# Altium footprint library Tomra_Cadstar_Footprints.PcbLib: 373 footprints (part 18 of 24)
Each footprint in its own frame and in the unit in brackets; x right, y up, seen from the top. Pads: shape width x height; smd on the part's side, far side on the other; paste and mask are expansions set on the pad; w line width, h text height; cw(c..) or ccw(c..) is an arc to the next point about the centre after c.
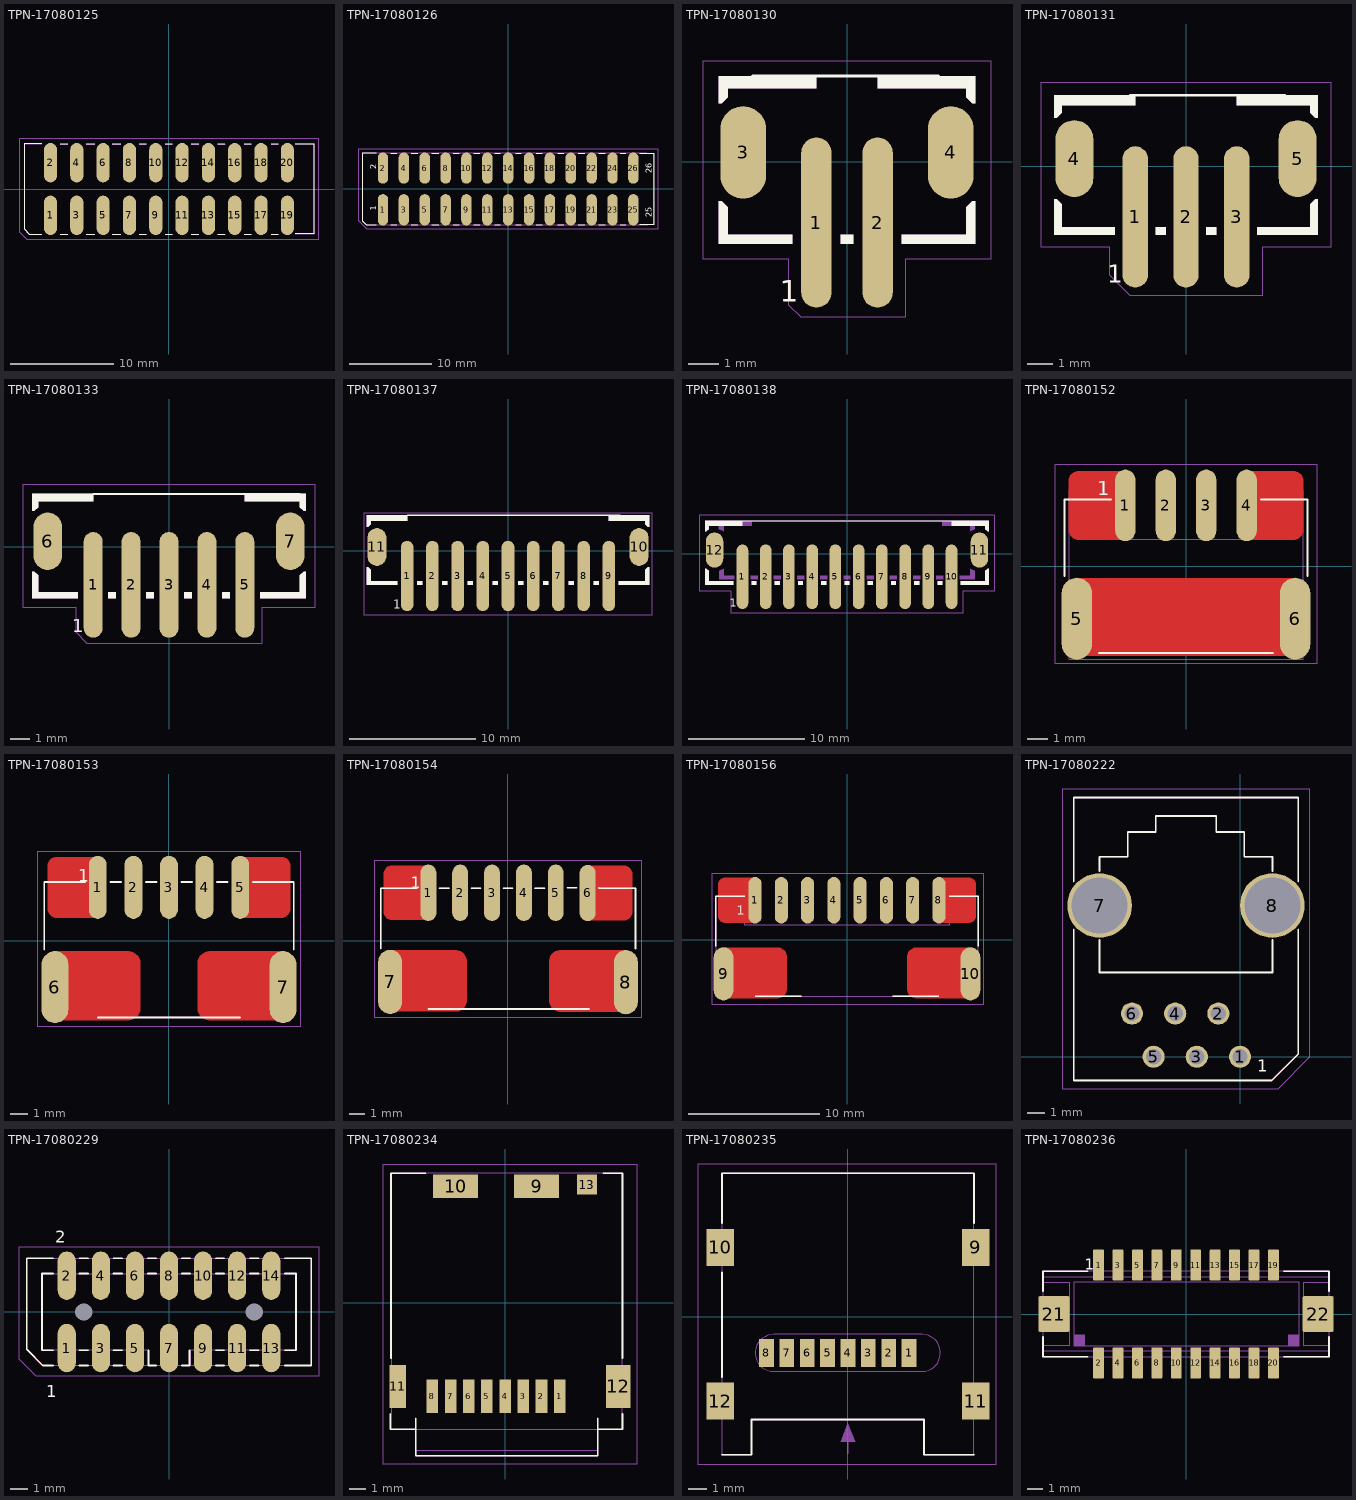
[diagram p17: the footprints below, top view; thin cyan lines are the x and y axes]

## TPN-17080125 [mm]
height 12
pads (20):
  oval 1.27x3.81 smd paste+0 mask+0: 1(-11.43,-2.54) 2(-11.43,2.54) 3(-8.89,-2.54) 4(-8.89,2.54) 5(-6.35,-2.54) 6(-6.35,2.54) 7(-3.81,-2.54) 8(-3.81,2.54) 9(-1.27,-2.54) 10(-1.27,2.54) 11(1.27,-2.54) 12(1.27,2.54) 13(3.81,-2.54) 14(3.81,2.54) 15(6.35,-2.54) 16(6.35,2.54) 17(8.89,-2.54) 18(8.89,2.54) 19(11.43,-2.54) 20(11.43,2.54)
Top Silk:
  lines w0.1: -12.27,-4.35 -13.47,-4.35 -13.97,-3.85 -13.97,4.35 -12.27,4.35 ; -10.47,-4.35 -9.77,-4.35 ; -10.47,4.35 -9.77,4.35 ; -7.97,-4.35 -7.17,-4.35 ; -7.97,4.35 -7.17,4.35 ; -5.47,-4.35 -4.67,-4.35 ; -5.47,4.35 -4.67,4.35 ; -2.87,-4.35 -2.17,-4.35 ; -2.87,4.35 -2.17,4.35 ; -0.37,-4.35 0.33,-4.35 ; -0.37,4.35 0.33,4.35 ; 2.17,-4.35 2.87,-4.35 ; 2.17,4.35 2.87,4.35 ; 4.71,-4.35 5.41,-4.35 ; 4.71,4.35 5.41,4.35 ; 7.25,-4.35 7.95,-4.35 ; 7.25,4.35 7.95,4.35 ; 9.85,-4.35 10.55,-4.35 ; 9.85,4.35 10.55,4.35 ; 12.18,-4.34 13.98,-4.34 13.98,4.36 12.18,4.36
  text ".Designator" at 0,0 h0.7
Top Assembly:
  lines w0.05: -12.268,-4.357 -13.468,-4.357 -13.968,-3.857 -13.968,4.343 -12.268,4.343 ; -10.468,-4.357 -9.768,-4.357 ; -10.468,4.343 -9.768,4.343 ; -7.968,-4.357 -7.168,-4.357 ; -7.968,4.343 -7.168,4.343 ; -5.468,-4.357 -4.668,-4.357 ; -5.468,4.343 -4.668,4.343 ; -2.868,-4.357 -2.168,-4.357 ; -2.868,4.343 -2.168,4.343 ; -0.368,-4.357 0.332,-4.357 ; -0.368,4.343 0.332,4.343 ; 2.172,-4.357 2.872,-4.357 ; 2.172,4.343 2.872,4.343 ; 4.712,-4.357 5.412,-4.357 ; 4.712,4.343 5.412,4.343 ; 7.252,-4.357 7.952,-4.357 ; 7.252,4.343 7.952,4.343 ; 9.852,-4.357 10.552,-4.357 ; 9.852,4.343 10.552,4.343 ; 12.182,-4.347 13.982,-4.347 13.982,4.353 12.182,4.353
Top Placement:
  lines w0.01: -14.47,-4.115 -13.738,-4.847 14.482,-4.847 14.482,4.85 -14.47,4.85 -14.47,-4.115

## TPN-17080126 [mm]
height 12
pads (26):
  oval 1.27x3.81 smd paste+0 mask+0: 1(-15.24,-2.54) 2(-15.24,2.54) 3(-12.7,-2.54) 4(-12.7,2.54) 5(-10.16,-2.54) 6(-10.16,2.54) 7(-7.62,-2.54) 8(-7.62,2.54) 9(-5.08,-2.54) 10(-5.08,2.54) 11(-2.54,-2.54) 12(-2.54,2.54) 13(0,-2.54) 14(0,2.54) 15(2.54,-2.54) 16(2.54,2.54) 17(5.08,-2.54) 18(5.08,2.54) 19(7.62,-2.54) 20(7.62,2.54) 21(10.16,-2.54) 22(10.16,2.54) 23(12.7,-2.54) 24(12.7,2.54) 25(15.24,-2.54) 26(15.24,2.54)
Top Silk:
  lines w0.1: -16.08,-4.35 -17.28,-4.35 -17.78,-3.85 -17.78,4.35 -16.08,4.35 ; -14.28,-4.35 -13.58,-4.35 ; -14.28,4.35 -13.58,4.35 ; -11.78,-4.35 -10.98,-4.35 ; -11.78,4.35 -10.98,4.35 ; -9.28,-4.35 -8.48,-4.35 ; -9.28,4.35 -8.48,4.35 ; -6.68,-4.35 -5.98,-4.35 ; -6.68,4.35 -5.98,4.35 ; -4.18,-4.35 -3.48,-4.35 ; -4.18,4.35 -3.48,4.35 ; -1.64,-4.35 -0.94,-4.35 ; -1.64,4.35 -0.94,4.35 ; 0.9,-4.35 1.6,-4.35 ; 0.9,4.35 1.6,4.35 ; 3.44,-4.35 4.14,-4.35 ; 3.44,4.35 4.14,4.35 ; 6.04,-4.35 6.74,-4.35 ; 6.04,4.35 6.74,4.35 ; 8.54,-4.35 9.34,-4.35 ; 8.54,4.35 9.34,4.35 ; 11.04,-4.35 11.84,-4.35 ; 11.04,4.35 11.84,4.35 ; 13.64,-4.35 14.34,-4.35 ; 13.64,4.35 14.34,4.35 ; 16.035,-4.361 17.735,-4.361 17.735,4.339 16.035,4.339
  text "2" at -16.053,2.413 h0.7
  text "1" at -16.053,-2.667 h0.7
  text "2" at -16.053,2.413 h0.7
  text "1" at -16.053,-2.667 h0.7
  text "26" at 17.47,1.894 h0.7
  text "25" at 17.47,-3.44 h0.7
  text "25" at 17.47,-3.44 h0.7
  text "26" at 17.47,1.894 h0.7
  text ".Designator" at 0,0 h0.7
Top Assembly:
  lines w0.05: 15.97,-4.34 17.67,-4.34 17.67,4.36 15.97,4.36 ; 16.87,4.36 -17.78,4.35 -17.78,-3.85 -17.28,-4.35 16.97,-4.34
  text "2" at -16.053,2.413 h0.7
  text "1" at -16.053,-2.667 h0.7
  text "2" at -16.053,2.413 h0.7
  text "1" at -16.053,-2.667 h0.7
  text "25" at 17.47,-3.44 h0.7
  text "26" at 17.47,1.894 h0.7
Top Placement:
  lines w0.01: -18.28,-3.81 -17.229,-4.861 18.235,-4.861 18.235,4.85 -18.28,4.85 -18.28,-3.81

## TPN-17080130 [mm]
height 7
pads (4):
  oval 1x5.572 smd paste+0 mask+0: 1(-1,-2) 2(1,-2)
  oval 1.5x3.024 smd paste+0 mask+0: 3(-3.4,0.3) 4(3.4,0.3)
Top Silk:
  region: 1,2.8 4.2,2.8 4.2,1.9 4.1,1.9 3.9,2.1 3.9,2.4 1,2.4
  region: -1,2.8 -4.2,2.8 -4.2,1.9 -4.1,1.9 -3.9,2.1 -3.9,2.4 -1,2.4
  region: -0.2,-2.4 0.2,-2.4 0.2,-2.7 -0.2,-2.7
  region: -4.2,-1.3 -4.1,-1.3 -3.9,-1.5 -3.9,-2.4 -1.8,-2.4 -1.8,-2.7 -4.2,-2.7
  region: 4.2,-1.3 4.1,-1.3 3.9,-1.5 3.9,-2.4 1.8,-2.4 1.8,-2.7 4.2,-2.7
  lines w0.1: -3.1,2.8 3,2.8
  text "1" at -2.2,-4.6 h0.7
  text ".Designator" at 0,0 h0.7
Top Assembly:
  region: 1,2.8 4.2,2.8 4.2,1.9 4.1,1.9 3.9,2.1 3.9,2.4 1,2.4
  region: -1,2.8 -4.2,2.8 -4.2,1.9 -4.1,1.9 -3.9,2.1 -3.9,2.4 -1,2.4
  region: -0.2,-2.4 0.2,-2.4 0.2,-2.7 -0.2,-2.7
  region: -4.2,-1.3 -4.1,-1.3 -3.9,-1.5 -3.9,-2.4 -1.8,-2.4 -1.8,-2.7 -4.2,-2.7
  region: 4.2,-1.3 4.1,-1.3 3.9,-1.5 3.9,-2.4 1.8,-2.4 1.8,-2.7 4.2,-2.7
  lines w0.05: -3.1,2.8 3,2.8
  text "1" at -2.1,-4.6 h0.7
Top Placement:
  lines w0.01: -4.7,-3.2 -4.7,3.3 4.7,3.3 4.7,-3.2 1.9,-3.2 1.9,-5.1 -1.5,-5.1 -1.9,-4.7 -1.9,-3.2 -4.7,-3.2
  text "JST PH-2" at -2.4,1.1 h0.7

## TPN-17080131 [mm]
height 7
pads (5):
  oval 1x5.572 smd paste+0 mask+0: 1(-2,-2) 2(0,-2) 3(2,-2)
  oval 1.5x3.024 smd paste+0 mask+0: 4(-4.4,0.3) 5(4.4,0.3)
Top Silk:
  region: -2,2.8 -5.2,2.8 -5.2,1.9 -5.1,1.9 -4.9,2.1 -4.9,2.4 -2,2.4
  region: -1.2,-2.4 -0.8,-2.4 -0.8,-2.7 -1.2,-2.7
  region: -5.2,-1.3 -5.1,-1.3 -4.9,-1.5 -4.9,-2.4 -2.8,-2.4 -2.8,-2.7 -5.2,-2.7
  region: 2,2.8 5.2,2.8 5.2,1.9 5.1,1.9 4.9,2.1 4.9,2.4 2,2.4
  region: 5.2,-1.3 5.1,-1.3 4.9,-1.5 4.9,-2.4 2.8,-2.4 2.8,-2.7 5.2,-2.7
  region: 0.8,-2.4 1.2,-2.4 1.2,-2.7 0.8,-2.7
  lines w0.1: -2.2,2.8 3.9,2.8
  text "1" at -3.1,-4.6 h0.7
  text ".Designator" at 0,0 h0.7
Top Assembly:
  region: -2,2.8 -5.2,2.8 -5.2,1.9 -5.1,1.9 -4.9,2.1 -4.9,2.4 -2,2.4
  region: -1.2,-2.4 -0.8,-2.4 -0.8,-2.7 -1.2,-2.7
  region: -5.2,-1.3 -5.1,-1.3 -4.9,-1.5 -4.9,-2.4 -2.8,-2.4 -2.8,-2.7 -5.2,-2.7
  region: 2,2.8 5.2,2.8 5.2,1.9 5.1,1.9 4.9,2.1 4.9,2.4 2,2.4
  region: 5.2,-1.3 5.1,-1.3 4.9,-1.5 4.9,-2.4 2.8,-2.4 2.8,-2.7 5.2,-2.7
  region: 0.8,-2.4 1.2,-2.4 1.2,-2.7 0.8,-2.7
  lines w0.05: -2.2,2.8 3.9,2.8
  text "1" at -3,-4.6 h0.7
Top Placement:
  lines w0.01: -5.7,-3.2 -5.7,3.3 5.7,3.3 5.7,-3.2 3,-3.2 3,-5.1 -2.2,-5.1 -3,-4.3 -3,-3.2 -5.7,-3.2
  text "JST PH-3" at -2.6,1.1 h0.7

## TPN-17080133 [mm]
height 7
pads (7):
  oval 1x5.572 smd paste+0 mask+0: 1(-4,-2) 2(-2,-2) 3(0,-2) 4(2,-2) 5(4,-2)
  oval 1.5x3.024 smd paste+0 mask+0: 6(-6.4,0.3) 7(6.4,0.3)
Top Silk:
  region: 0.8,-2.4 1.2,-2.4 1.2,-2.7 0.8,-2.7
  region: 7.2,-1.3 7.1,-1.3 6.9,-1.5 6.9,-2.4 4.8,-2.4 4.8,-2.7 7.2,-2.7
  region: 4,2.8 7.2,2.8 7.2,1.9 7.1,1.9 6.9,2.1 6.9,2.4 4,2.4
  region: 2.8,-2.4 3.2,-2.4 3.2,-2.7 2.8,-2.7
  region: -4,2.8 -7.2,2.8 -7.2,1.9 -7.1,1.9 -6.9,2.1 -6.9,2.4 -4,2.4
  region: -3.2,-2.4 -2.8,-2.4 -2.8,-2.7 -3.2,-2.7
  region: -7.2,-1.3 -7.1,-1.3 -6.9,-1.5 -6.9,-2.4 -4.8,-2.4 -4.8,-2.7 -7.2,-2.7
  region: -1.2,-2.4 -0.8,-2.4 -0.8,-2.7 -1.2,-2.7
  lines w0.1: -4,2.8 6.9,2.8
  text "1" at -5.1,-4.5 h0.7
  text ".Designator" at 0,0 h0.7
Top Assembly:
  region: 0.8,-2.4 1.2,-2.4 1.2,-2.7 0.8,-2.7
  region: 7.2,-1.3 7.1,-1.3 6.9,-1.5 6.9,-2.4 4.8,-2.4 4.8,-2.7 7.2,-2.7
  region: 4,2.8 7.2,2.8 7.2,1.9 7.1,1.9 6.9,2.1 6.9,2.4 4,2.4
  region: 2.8,-2.4 3.2,-2.4 3.2,-2.7 2.8,-2.7
  region: -4,2.8 -7.2,2.8 -7.2,1.9 -7.1,1.9 -6.9,2.1 -6.9,2.4 -4,2.4
  region: -3.2,-2.4 -2.8,-2.4 -2.8,-2.7 -3.2,-2.7
  region: -7.2,-1.3 -7.1,-1.3 -6.9,-1.5 -6.9,-2.4 -4.8,-2.4 -4.8,-2.7 -7.2,-2.7
  region: -1.2,-2.4 -0.8,-2.4 -0.8,-2.7 -1.2,-2.7
  lines w0.05: -4,2.8 6.9,2.8
  text "1" at -5,-4.5 h0.7
Top Placement:
  lines w0.01: -7.7,-3.2 -7.7,3.3 7.7,3.3 7.7,-3.2 4.9,-3.2 4.9,-5.1 -4.3,-5.1 -4.9,-4.5 -4.9,-3.2 -7.7,-3.2
  text "JST PH-5-180" at -3.8,1.1 h0.7

## TPN-17080137 [mm]
height 7
pads (11):
  oval 1x5.572 smd paste+0 mask+0: 1(-8,-2) 2(-6,-2) 3(-4,-2) 4(-2,-2) 5(0,-2) 6(2,-2) 7(4,-2) 8(6,-2) 9(8,-2)
  oval 1.5x3 smd paste+0 mask+0: 10(10.4,0.3) 11(-10.4,0.3)
Top Silk:
  region: -3.2,-2.4 -2.8,-2.4 -2.8,-2.7 -3.2,-2.7
  region: -1.2,-2.4 -0.8,-2.4 -0.8,-2.7 -1.2,-2.7
  region: -8,2.8 -11.2,2.8 -11.2,1.9 -11.1,1.9 -10.9,2.1 -10.9,2.4 -8,2.4
  region: -7.2,-2.4 -6.8,-2.4 -6.8,-2.7 -7.2,-2.7
  region: -11.2,-1.3 -11.1,-1.3 -10.9,-1.5 -10.9,-2.4 -8.8,-2.4 -8.8,-2.7 -11.2,-2.7
  region: -5.2,-2.4 -4.8,-2.4 -4.8,-2.7 -5.2,-2.7
  region: 0.8,-2.4 1.2,-2.4 1.2,-2.7 0.8,-2.7
  region: 2.8,-2.4 3.2,-2.4 3.2,-2.7 2.8,-2.7
  region: 4.8,-2.4 5.2,-2.4 5.2,-2.7 4.8,-2.7
  region: 11.2,-1.3 11.1,-1.3 10.9,-1.5 10.9,-2.4 8.8,-2.4 8.8,-2.7 11.2,-2.7
  region: 8,2.8 11.2,2.8 11.2,1.9 11.1,1.9 10.9,2.1 10.9,2.4 8,2.4
  region: 6.8,-2.4 7.2,-2.4 7.2,-2.7 6.8,-2.7
  lines w0.1: -8,2.8 8.9,2.8
  text "1" at -9.1,-4.6 h0.7
  text ".Designator" at -11.2,2.8 h0.7
Top Assembly:
  region: -3.2,-2.4 -2.8,-2.4 -2.8,-2.7 -3.2,-2.7
  region: -1.2,-2.4 -0.8,-2.4 -0.8,-2.7 -1.2,-2.7
  region: -8,2.8 -11.2,2.8 -11.2,1.9 -11.1,1.9 -10.9,2.1 -10.9,2.4 -8,2.4
  region: -7.2,-2.4 -6.8,-2.4 -6.8,-2.7 -7.2,-2.7
  region: -11.2,-1.3 -11.1,-1.3 -10.9,-1.5 -10.9,-2.4 -8.8,-2.4 -8.8,-2.7 -11.2,-2.7
  region: -5.2,-2.4 -4.8,-2.4 -4.8,-2.7 -5.2,-2.7
  region: 0.8,-2.4 1.2,-2.4 1.2,-2.7 0.8,-2.7
  region: 2.8,-2.4 3.2,-2.4 3.2,-2.7 2.8,-2.7
  region: 4.8,-2.4 5.2,-2.4 5.2,-2.7 4.8,-2.7
  region: 11.2,-1.3 11.1,-1.3 10.9,-1.5 10.9,-2.4 8.8,-2.4 8.8,-2.7 11.2,-2.7
  region: 8,2.8 11.2,2.8 11.2,1.9 11.1,1.9 10.9,2.1 10.9,2.4 8,2.4
  region: 6.8,-2.4 7.2,-2.4 7.2,-2.7 6.8,-2.7
  lines w0.05: -8,2.8 8.9,2.8
  text "1" at -9,-4.6 h0.7
Top Placement:
  lines w0.01: -11.4,-5.1 11.4,-5.1 11.4,3 -11.4,3 -11.4,-5.1

## TPN-17080138 [mm]
height 7
pads (12):
  oval 1x5.572 smd paste+0 mask+0: 1(-9,-2) 2(-7,-2) 3(-5,-2) 4(-3,-2) 5(-1,-2) 6(1,-2) 7(3,-2) 8(5,-2) 9(7,-2) 10(9,-2)
  oval 1.5x3.024 smd paste+0 mask+0: 11(11.4,0.3) 12(-11.4,0.3)
Top Silk:
  region: -4.2,-2.4 -3.8,-2.4 -3.8,-2.7 -4.2,-2.7
  region: -2.2,-2.4 -1.8,-2.4 -1.8,-2.7 -2.2,-2.7
  region: -9,2.8 -12.2,2.8 -12.2,1.9 -12.1,1.9 -11.9,2.1 -11.9,2.4 -9,2.4
  region: -8.2,-2.4 -7.8,-2.4 -7.8,-2.7 -8.2,-2.7
  region: -12.2,-1.3 -12.1,-1.3 -11.9,-1.5 -11.9,-2.4 -9.8,-2.4 -9.8,-2.7 -12.2,-2.7
  region: -6.2,-2.4 -5.8,-2.4 -5.8,-2.7 -6.2,-2.7
  region: -0.2,-2.4 0.2,-2.4 0.2,-2.7 -0.2,-2.7
  region: 1.8,-2.4 2.2,-2.4 2.2,-2.7 1.8,-2.7
  region: 3.8,-2.4 4.2,-2.4 4.2,-2.7 3.8,-2.7
  region: 5.8,-2.4 6.2,-2.4 6.2,-2.7 5.8,-2.7
  region: 12.2,-1.3 12.1,-1.3 11.9,-1.5 11.9,-2.4 9.8,-2.4 9.8,-2.7 12.2,-2.7
  region: 9,2.8 12.2,2.8 12.2,1.9 12.1,1.9 11.9,2.1 11.9,2.4 9,2.4
  region: 7.8,-2.4 8.2,-2.4 8.2,-2.7 7.8,-2.7
  lines w0.1: -9,2.8 11.9,2.8
  text "1" at -10.1,-4.6 h0.7
  text ".Designator" at 0,0 h0.7
Top Assembly:
  region: -0.3,-1.9 0.3,-1.9 0.3,-2.2 -0.3,-2.2
  region: 3.7,-1.9 4.3,-1.9 4.3,-2.2 3.7,-2.2
  region: 1.7,-1.9 2.3,-1.9 2.3,-2.2 1.7,-2.2
  region: -8.3,-1.9 -7.7,-1.9 -7.7,-2.2 -8.3,-2.2
  region: -6.3,-1.9 -5.7,-1.9 -5.7,-2.2 -6.3,-2.2
  region: -4.3,-1.9 -3.7,-1.9 -3.7,-2.2 -4.3,-2.2
  region: -2.3,-1.9 -1.7,-1.9 -1.7,-2.2 -2.3,-2.2
  region: -8.2,2.8 -8.2,2.4 -10.6,2.4 -10.6,1.9 -11,2.1 -11,2.8
  region: -11,-1.5 -11,-2.2 -9.7,-2.2 -9.7,-1.9 -10.6,-1.9 -10.6,-1.3
  region: 5.7,-1.9 6.3,-1.9 6.3,-2.2 5.7,-2.2
  region: 8.2,2.8 8.2,2.4 10.6,2.4 10.6,1.9 11,2.1 11,2.8
  region: 11,-1.5 11,-2.2 9.7,-2.2 9.7,-1.9 10.6,-1.9 10.6,-1.3
  region: 7.7,-1.9 8.3,-1.9 8.3,-2.2 7.7,-2.2
  region: -4.2,-2.4 -3.8,-2.4 -3.8,-2.7 -4.2,-2.7
  region: -2.2,-2.4 -1.8,-2.4 -1.8,-2.7 -2.2,-2.7
  region: -9,2.8 -12.2,2.8 -12.2,1.9 -12.1,1.9 -11.9,2.1 -11.9,2.4 -9,2.4
  region: -8.2,-2.4 -7.8,-2.4 -7.8,-2.7 -8.2,-2.7
  region: -12.2,-1.3 -12.1,-1.3 -11.9,-1.5 -11.9,-2.4 -9.8,-2.4 -9.8,-2.7 -12.2,-2.7
  region: -6.2,-2.4 -5.8,-2.4 -5.8,-2.7 -6.2,-2.7
  region: -0.2,-2.4 0.2,-2.4 0.2,-2.7 -0.2,-2.7
  region: 1.8,-2.4 2.2,-2.4 2.2,-2.7 1.8,-2.7
  region: 3.8,-2.4 4.2,-2.4 4.2,-2.7 3.8,-2.7
  region: 5.8,-2.4 6.2,-2.4 6.2,-2.7 5.8,-2.7
  region: 12.2,-1.3 12.1,-1.3 11.9,-1.5 11.9,-2.4 9.8,-2.4 9.8,-2.7 12.2,-2.7
  region: 9,2.8 12.2,2.8 12.2,1.9 12.1,1.9 11.9,2.1 11.9,2.4 9,2.4
  region: 7.8,-2.4 8.2,-2.4 8.2,-2.7 7.8,-2.7
  lines w0.05: -11,2.1 -11,2.8 10.8,2.8 10.8,2.1 ; -9,2.8 11.9,2.8
  text "1" at -10.1,-4.2 h0.7
Top Placement:
  lines w0.01: -12.7,-3.2 -10,-3.2 -10,-5.105 10,-5.105 10,-3.2 12.7,-3.2 12.7,3.3 -12.7,3.3 -12.7,-3.2
  text "JST PH-10-180" at -3.6,1.3 h0.7

## TPN-17080152 [mm]
height 5.8
pads (6):
  oval 1x3.54 smd paste+0 mask+0: 1(-3,3) 2(-1,3) 3(1,3) 4(3,3)
  oval 1.5x4.04 smd paste+0 mask+0: 5(-5.4,-2.6) 6(5.4,-2.6)
Top Elec:
  region: -6,-1.3 -6,-1.231 -5.973,-1.096 -5.92,-0.968 -5.844,-0.854 -5.746,-0.756 -5.632,-0.68 -5.504,-0.627 -5.369,-0.6 -5.3,-0.6 5.3,-0.6 5.369,-0.6 5.504,-0.627 5.632,-0.68 5.746,-0.756 5.844,-0.854 5.92,-0.968 5.973,-1.096 6,-1.231 6,-1.3 6,-3.75 6,-3.819 5.973,-3.954 5.92,-4.082 5.844,-4.196 5.746,-4.294 5.632,-4.37 5.504,-4.423 5.369,-4.45 5.3,-4.45 -5.3,-4.45 -5.369,-4.45 -5.504,-4.423 -5.632,-4.37 -5.746,-4.294 -5.844,-4.196 -5.92,-4.082 -5.973,-3.954 -6,-3.819 -6,-3.75
  region: -5.8,4.2 -5.8,4.299 -5.724,4.483 -5.583,4.624 -5.399,4.7 -5.3,4.7 -3.1,4.7 -3.001,4.7 -2.817,4.624 -2.676,4.483 -2.6,4.299 -2.6,4.2 -2.6,1.8 -2.6,1.701 -2.676,1.517 -2.817,1.376 -3.001,1.3 -3.1,1.3 -5.3,1.3 -5.399,1.3 -5.583,1.376 -5.724,1.517 -5.8,1.701 -5.8,1.8
  region: 2.6,4.2 2.6,4.299 2.676,4.483 2.817,4.624 3.001,4.7 3.1,4.7 5.3,4.7 5.399,4.7 5.583,4.624 5.724,4.483 5.8,4.299 5.8,4.2 5.8,1.8 5.8,1.701 5.724,1.517 5.583,1.376 5.399,1.3 5.3,1.3 3.1,1.3 3.001,1.3 2.817,1.376 2.676,1.517 2.6,1.701 2.6,1.8
Top Silk:
  lines w0.1: -4.3,-4.3 4.3,-4.3 ; -6,3.3 -3.7,3.3 -6,3.3 ; -6,3.3 -6,-0.5 -6,3.3 ; 6,3.3 3.7,3.3 6,3.3 ; 6,3.3 6,-0.5 6,3.3
  text "1" at -4.4,3.5 h0.7
  text ".Designator" at -5.3,5 h0.7
Top Assembly:
  lines w0.05: -5.8,-4.6 5.8,-4.6 5.8,3.7 3.7,3.7 3.7,1.3 -3.7,1.3 -3.7,3.7 -5.8,3.7 -5.8,-4.6
  text "1" at -4.2,2 h0.7
Top Placement:
  lines w0.01: -6.5,-4.8 6.5,-4.8 6.5,5 -6.5,5 -6.5,-4.8

## TPN-17080153 [mm]
height 7
pads (7):
  oval 1x3.54 smd paste+0 mask+0: 1(-4,3) 2(-2,3) 3(0,3) 4(2,3) 5(4,3)
  oval 1.5x4.04 smd paste+0 mask+0: 6(-6.4,-2.6) 7(6.4,-2.6)
Top Elec:
  region: -7,-1.3 -7,-1.231 -6.973,-1.096 -6.92,-0.968 -6.844,-0.854 -6.746,-0.756 -6.632,-0.68 -6.504,-0.627 -6.369,-0.6 -6.3,-0.6 -2.3,-0.6 -2.231,-0.6 -2.096,-0.627 -1.968,-0.68 -1.854,-0.756 -1.756,-0.854 -1.68,-0.968 -1.627,-1.096 -1.6,-1.231 -1.6,-1.3 -1.6,-3.75 -1.6,-3.819 -1.627,-3.954 -1.68,-4.082 -1.756,-4.196 -1.854,-4.294 -1.968,-4.37 -2.096,-4.423 -2.231,-4.45 -2.3,-4.45 -6.3,-4.45 -6.369,-4.45 -6.504,-4.423 -6.632,-4.37 -6.746,-4.294 -6.844,-4.196 -6.92,-4.082 -6.973,-3.954 -7,-3.819 -7,-3.75
  region: -6.8,4.2 -6.8,4.299 -6.724,4.483 -6.583,4.624 -6.399,4.7 -6.3,4.7 -4.1,4.7 -4.001,4.7 -3.817,4.624 -3.676,4.483 -3.6,4.299 -3.6,4.2 -3.6,1.8 -3.6,1.701 -3.676,1.517 -3.817,1.376 -4.001,1.3 -4.1,1.3 -6.3,1.3 -6.399,1.3 -6.583,1.376 -6.724,1.517 -6.8,1.701 -6.8,1.8
  region: 3.6,4.2 3.6,4.299 3.676,4.483 3.817,4.624 4.001,4.7 4.1,4.7 6.3,4.7 6.399,4.7 6.583,4.624 6.724,4.483 6.8,4.299 6.8,4.2 6.8,1.8 6.8,1.701 6.724,1.517 6.583,1.376 6.399,1.3 6.3,1.3 4.1,1.3 4.001,1.3 3.817,1.376 3.676,1.517 3.6,1.701 3.6,1.8
  region: 1.6,-1.3 1.6,-1.231 1.627,-1.096 1.68,-0.968 1.756,-0.854 1.854,-0.756 1.968,-0.68 2.096,-0.627 2.231,-0.6 2.3,-0.6 6.3,-0.6 6.369,-0.6 6.504,-0.627 6.632,-0.68 6.746,-0.756 6.844,-0.854 6.92,-0.968 6.973,-1.096 7,-1.231 7,-1.3 7,-3.75 7,-3.819 6.973,-3.954 6.92,-4.082 6.844,-4.196 6.746,-4.294 6.632,-4.37 6.504,-4.423 6.369,-4.45 6.3,-4.45 2.3,-4.45 2.231,-4.45 2.096,-4.423 1.968,-4.37 1.854,-4.294 1.756,-4.196 1.68,-4.082 1.627,-3.954 1.6,-3.819 1.6,-3.75
Top Silk:
  lines w0.1: -7,-0.5 -7,3.3 -4.7,3.3 ; -4,-4.3 -0.5,-4.3 ; -3.3,3.3 -2.7,3.3 ; -2,-4.3 3,-4.3 ; -1.3,3.3 -0.7,3.3 ; 0.5,-4.3 4,-4.3 ; 0.7,3.3 1.3,3.3 ; 2.7,3.3 3.3,3.3 ; 4.7,3.3 7,3.3 7,-0.5
  text "1" at -5.1,3.3 h0.7
  text ".Designator" at -7.4,5 h0.7
Top Assembly:
  lines w0.05: -7,-0.5 -7,3.3 -4.7,3.3 ; -5.5,-4.3 -0.5,-4.3 ; -3.3,3.3 -2.7,3.3 ; -2,-4.3 3,-4.3 ; -1.3,3.3 -0.7,3.3 ; 0.5,-4.3 5.5,-4.3 ; 0.7,3.3 1.3,3.3 ; 2.7,3.3 3.3,3.3 ; 4.7,3.3 7,3.3 7,-0.5
  text "1" at -5.1,3.3 h0.7
Top Placement:
  lines w0.01: -7.4,-4.8 7.4,-4.8 7.4,5 -7.4,5 -7.4,-4.8

## TPN-17080154 [mm]
height 7
pads (8):
  oval 1x3.54 smd paste+0 mask+0: 1(-5,3) 2(-3,3) 3(-1,3) 4(1,3) 5(3,3) 6(5.005,2.991)
  oval 1.5x4.04 smd paste+0 mask+0: 7(-7.4,-2.6) 8(7.405,-2.609)
Top Elec:
  region: -8,-1.3 -8,-1.231 -7.973,-1.096 -7.92,-0.968 -7.844,-0.854 -7.746,-0.756 -7.632,-0.68 -7.504,-0.627 -7.369,-0.6 -7.3,-0.6 -3.3,-0.6 -3.231,-0.6 -3.096,-0.627 -2.968,-0.68 -2.854,-0.756 -2.756,-0.854 -2.68,-0.968 -2.627,-1.096 -2.6,-1.231 -2.6,-1.3 -2.6,-3.75 -2.6,-3.819 -2.627,-3.954 -2.68,-4.082 -2.756,-4.196 -2.854,-4.294 -2.968,-4.37 -3.096,-4.423 -3.231,-4.45 -3.3,-4.45 -7.3,-4.45 -7.369,-4.45 -7.504,-4.423 -7.632,-4.37 -7.746,-4.294 -7.844,-4.196 -7.92,-4.082 -7.973,-3.954 -8,-3.819 -8,-3.75
  region: -7.8,4.2 -7.8,4.299 -7.724,4.483 -7.583,4.624 -7.399,4.7 -7.3,4.7 -5.1,4.7 -5.001,4.7 -4.817,4.624 -4.676,4.483 -4.6,4.299 -4.6,4.2 -4.6,1.8 -4.6,1.701 -4.676,1.517 -4.817,1.376 -5.001,1.3 -5.1,1.3 -7.3,1.3 -7.399,1.3 -7.583,1.376 -7.724,1.517 -7.8,1.701 -7.8,1.8
  region: 4.605,4.191 4.605,4.29 4.681,4.474 4.822,4.615 5.006,4.691 5.105,4.691 7.305,4.691 7.404,4.691 7.588,4.615 7.729,4.474 7.805,4.29 7.805,4.191 7.805,1.791 7.805,1.692 7.729,1.508 7.588,1.367 7.404,1.291 7.305,1.291 5.105,1.291 5.006,1.291 4.822,1.367 4.681,1.508 4.605,1.692 4.605,1.791
  region: 2.605,-1.309 2.601,-1.239 2.622,-1.1 2.672,-0.969 2.748,-0.851 2.847,-0.752 2.965,-0.675 3.096,-0.626 3.235,-0.605 3.305,-0.609 7.305,-0.609 7.374,-0.609 7.509,-0.636 7.637,-0.689 7.751,-0.765 7.849,-0.863 7.925,-0.977 7.978,-1.105 8.005,-1.24 8.005,-1.309 8.005,-3.759 8.005,-3.828 7.978,-3.963 7.925,-4.091 7.849,-4.205 7.751,-4.303 7.637,-4.379 7.509,-4.432 7.374,-4.459 7.305,-4.459 3.305,-4.459 3.236,-4.459 3.101,-4.432 2.973,-4.379 2.859,-4.303 2.761,-4.205 2.685,-4.091 2.632,-3.963 2.605,-3.828 2.605,-3.759
Top Silk:
  lines w0.1: -8,-0.5 -8,3.3 -5.7,3.3 ; -5,-4.3 -1.5,-4.3 ; -4.3,3.3 -3.7,3.3 ; -3,-4.3 2,-4.3 ; -2.3,3.3 -1.7,3.3 ; -0.5,-4.3 5.103,-4.298 ; -0.3,3.3 0.3,3.3 ; 1.7,3.3 2.3,3.3 ; 3.716,3.318 4.316,3.318 ; 5.716,3.301 8.013,3.3 8.013,-0.5
  text "1" at -6.1,3.3 h0.7
  text ".Designator" at -8.4,5 h0.7
Top Assembly:
  lines w0.05: -8,-0.5 -8,3.3 -5.7,3.3 ; -6.5,-4.3 -1.5,-4.3 ; -4.3,3.3 -3.7,3.3 ; -3,-4.3 2,-4.3 ; -2.3,3.3 -1.7,3.3 ; -0.5,-4.3 6.484,-4.301 ; -0.3,3.3 0.3,3.3 ; 1.7,3.3 2.3,3.3 ; 3.713,3.317 4.313,3.317 ; 5.711,3.304 8.015,3.3 8.015,-0.5
  text "1" at -6.1,3.3 h0.7
Top Placement:
  lines w0.01: -8.4,-4.8 8.389,-4.8 8.389,5 -8.4,5 -8.4,-4.8

## TPN-17080156 [mm]
height 7
pads (10):
  oval 1x3.54 smd paste+0 mask+0: 1(-7,3) 2(-5,3) 3(-3,3) 4(-1,3) 5(1,3) 6(3,3) 7(5,3) 8(7,3)
  oval 1.5x4.04 smd paste+0 mask+0: 9(-9.4,-2.6) 10(9.4,-2.6)
Top Elec:
  region: -10,-1.3 -10,-1.231 -9.973,-1.096 -9.92,-0.968 -9.844,-0.854 -9.746,-0.756 -9.632,-0.68 -9.504,-0.627 -9.369,-0.6 -9.3,-0.6 -5.3,-0.6 -5.231,-0.6 -5.096,-0.627 -4.968,-0.68 -4.854,-0.756 -4.756,-0.854 -4.68,-0.968 -4.627,-1.096 -4.6,-1.231 -4.6,-1.3 -4.6,-3.75 -4.6,-3.819 -4.627,-3.954 -4.68,-4.082 -4.756,-4.196 -4.854,-4.294 -4.968,-4.37 -5.096,-4.423 -5.231,-4.45 -5.3,-4.45 -9.3,-4.45 -9.369,-4.45 -9.504,-4.423 -9.632,-4.37 -9.746,-4.294 -9.844,-4.196 -9.92,-4.082 -9.973,-3.954 -10,-3.819 -10,-3.75
  region: -9.8,4.2 -9.8,4.299 -9.724,4.483 -9.583,4.624 -9.399,4.7 -9.3,4.7 -7.1,4.7 -7.001,4.7 -6.817,4.624 -6.676,4.483 -6.6,4.299 -6.6,4.2 -6.6,1.8 -6.6,1.701 -6.676,1.517 -6.817,1.376 -7.001,1.3 -7.1,1.3 -9.3,1.3 -9.399,1.3 -9.583,1.376 -9.724,1.517 -9.8,1.701 -9.8,1.8
  region: 6.6,4.2 6.6,4.299 6.676,4.483 6.817,4.624 7.001,4.7 7.1,4.7 9.3,4.7 9.399,4.7 9.583,4.624 9.724,4.483 9.8,4.299 9.8,4.2 9.8,1.8 9.8,1.701 9.724,1.517 9.583,1.376 9.399,1.3 9.3,1.3 7.1,1.3 7.001,1.3 6.817,1.376 6.676,1.517 6.6,1.701 6.6,1.8
  region: 4.6,-1.3 4.6,-1.231 4.627,-1.096 4.68,-0.968 4.756,-0.854 4.854,-0.756 4.968,-0.68 5.096,-0.627 5.231,-0.6 5.3,-0.6 9.3,-0.6 9.369,-0.6 9.504,-0.627 9.632,-0.68 9.746,-0.756 9.844,-0.854 9.92,-0.968 9.973,-1.096 10,-1.231 10,-1.3 10,-3.75 10,-3.819 9.973,-3.954 9.92,-4.082 9.844,-4.196 9.746,-4.294 9.632,-4.37 9.504,-4.423 9.369,-4.45 9.3,-4.45 5.3,-4.45 5.231,-4.45 5.096,-4.423 4.968,-4.37 4.854,-4.294 4.756,-4.196 4.68,-4.082 4.627,-3.954 4.6,-3.819 4.6,-3.75
Top Silk:
  lines w0.1: -10,-0.5 -10,3.3 -7.8,3.3 ; -7,-4.3 -3.5,-4.3 ; 3.5,-4.3 7,-4.3 ; 7.8,3.3 10,3.3 10,-0.5
  text "1" at -8.4,1.9 h0.7
  text ".Designator" at -8.035,5.135 h0.7
Top Assembly:
  lines w0.05: -8.5,-4.3 -3.5,-4.3 ; 3.5,-4.3 8.5,-4.3 ; -10,-4.3 10,-4.3 10,3.3 7.8,3.3 7.8,1.1 -7.8,1.1 -7.8,3.3 -10,3.3 -10,-4.3
  text "1" at -8.4,1.9 h0.7
Top Placement:
  lines w0.01: -10.3,-4.9 10.4,-4.9 10.4,5 -10.3,5 -10.3,-4.9

## TPN-17080222 [mm]
height 16.4
pads (8):
  round 1.3 / inner round 1.524 / far side round 1.3 hole 0.9 paste+0 mask+0: 1(0,0) 2(-1.27,2.54) 3(-2.54,0) 4(-3.81,2.54) 5(-5.08,0) 6(-6.35,2.54)
  round 3.8 / inner round 1.524 / far side round 3.8 hole 3.3 paste+0 mask+0: 7(-8.255,8.89) 8(1.905,8.89)
Top Silk:
  lines w0.1: -9.779,7.493 -9.779,-1.397 1.872,-1.397 3.429,0.16 3.429,7.493 ; -9.779,10.287 -9.779,15.24 3.429,15.24 3.429,10.287 ; -8.255,6.858 -8.255,4.953 1.905,4.953 1.905,6.858 ; -8.255,10.922 -8.255,11.753 -6.604,11.753 -6.604,13.208 -4.953,13.208 -4.953,14.153 -1.397,14.153 -1.397,13.208 0.254,13.208 0.254,11.753 1.905,11.753 1.905,10.922
  text "1" at 1.016,-0.889 h0.7
  text ".Designator" at 0,0 h0.7
Top Assembly:
  lines w0.05: -9.779,7.493 -9.779,-1.397 1.872,-1.397 3.429,0.16 3.429,7.493 ; -9.779,10.287 -9.779,15.24 3.429,15.24 3.429,10.287 ; -8.255,6.858 -8.255,4.953 1.905,4.953 1.905,6.858 ; -8.255,10.922 -8.255,11.753 -6.604,11.753 -6.604,13.208 -4.953,13.208 -4.953,14.153 -1.397,14.153 -1.397,13.208 0.254,13.208 0.254,11.753 1.905,11.753 1.905,10.922
  text "1" at 1.016,-0.889 h0.7
  text "180" at -6.731,9.233 h0.7
  text "Jack6-6" at -6.731,10.033 h0.7
Top Placement:
  lines w0.01: -10.425,-1.897 2.218,-1.897 4.075,-0.04 4.075,15.74 -10.425,15.74 -10.425,-1.897

## TPN-17080229 [mm]
height 8
pads (16):
  oval 1.06x2.838 smd paste+0 mask+0: 1(-6,-2.125) 2(-6,2.125) 3(-4,-2.125) 4(-4,2.125) 5(-2,-2.125) 6(-2,2.125) 7(0,-2.125) 8(0,2.125) 9(2,-2.125) 10(2,2.125) 11(4,-2.125) 12(4,2.125) 13(6,-2.125) 14(6,2.125)
  round 0 / inner round 1.524 / far side round 0 hole 1 unplated paste+0 mask+0: 15(-5,0) 16(5,0)
Top Silk:
  lines w0.1: -6.8,-3.15 -7.4,-3.15 -8.35,-2.2 -8.35,3.15 -6.8,3.15 ; -6.8,-2.25 -7.45,-2.25 -7.45,2.25 -6.8,2.25 ; -5.25,-3.15 -4.75,-3.15 ; -5.25,-2.25 -4.75,-2.25 ; -5.25,2.25 -4.75,2.25 ; -5.25,3.15 -4.75,3.15 ; -3.25,-3.15 -2.75,-3.15 ; -3.25,-2.25 -2.75,-2.25 ; -3.25,2.25 -2.75,2.25 ; -3.25,3.15 -2.75,3.15 ; -1.25,2.25 -0.75,2.25 ; -1.25,3.15 -0.75,3.15 ; -1.2,-2.25 -1.2,-3.15 -0.75,-3.15 ; 0.75,-3.15 1.2,-3.15 1.2,-2.25 ; 0.75,2.25 1.25,2.25 ; 0.75,3.15 1.25,3.15 ; 2.75,-3.15 3.25,-3.15 ; 2.75,-2.25 3.25,-2.25 ; 2.75,2.25 3.25,2.25 ; 2.75,3.15 3.25,3.15 ; 4.75,-3.15 5.25,-3.15 ; 4.75,-2.25 5.25,-2.25 ; 4.75,2.25 5.25,2.25 ; 4.75,3.15 5.25,3.15 ; 6.8,-3.15 8.35,-3.15 8.35,3.15 6.8,3.15 ; 6.8,-2.25 7.45,-2.25 7.45,2.25 6.8,2.25
  text "2" at -6.667,4.05 h0.7
  text "1" at -7.2,-5 h0.7
  text ".Designator" at 0,0 h0.7
Top Assembly:
  lines w0.05: -8.35,-2.2 -7.4,-3.15 8.35,-3.15 8.35,3.15 -8.35,3.15 -8.35,-2.2 ; -7.45,-2.25 -1.2,-2.25 -1.2,-3.15 1.25,-3.15 1.25,-2.25 7.45,-2.25 7.45,2.25 -7.45,2.25 -7.45,-2.25
  text "13" at 6.75,-5 h0.7
  text "14" at 6.8,3.15 h0.7
  text "2" at -7.5,3.25 h0.7
  text "1" at -7.25,-5 h0.7
Top Placement:
  lines w0.01: -8.8,-2.79 -7.8,-3.79 8.8,-3.79 8.8,3.83 -8.8,3.83 -8.8,-2.79

## TPN-17080234 [mm]
height 2
pads (13):
  rrect0% 0.7x2 smd paste+0 mask+0: 1(3.3,-5.65) 2(2.2,-5.65) 3(1.1,-5.65) 4(0,-5.65) 5(-1.1,-5.65) 6(-2.2,-5.65) 7(-3.3,-5.65) 8(-4.4,-5.65)
  rrect0% 2.7x1.4 smd paste+0 mask+0: 9(1.9,7.05) 10(-3,7.05)
  rrect0% 1x2.6 smd paste+0 mask+0: 11(-6.5,-5.05)
  rrect0% 1.5x2.6 smd paste+0 mask+0: 12(6.85,-5.05)
  rect 1.2x1.2 smd paste+0 mask+0: 13(4.95,7.15)
Top Silk:
  lines w0.1: -6.95,-6.7 -6.95,-7.65 -5.4,-7.65 ; -6.9,-3.35 -6.9,7.85 -4.8,7.85 ; -5.4,-7 -5.4,-9.25 5.6,-9.25 5.6,-7 ; 5.6,-7.65 7.1,-7.65 7.1,-6.7 ; 5.95,7.85 7.1,7.85 7.1,-3.35
  text ".Designator" at 0,0 h0.7
Top Assembly:
  lines w0.05: -6.9,-7.65 7.1,-7.65 7.1,7.85 -6.9,7.85 -6.9,-7.65 ; -5.4,-9.25 5.6,-9.25 5.6,-8.95 -5.4,-8.95 -5.4,-9.25
Top Placement:
  lines w0.01: -7.4,-9.75 8,-9.75 8,8.35 -7.4,8.35 -7.4,-9.75

## TPN-17080235 [mm]
height 2
pads (12):
  rrect0% 0.8x1.5 smd paste+0 mask+0: 1(3.3,-1.95) 2(2.2,-1.95) 3(1.1,-1.95) 4(0,-1.95) 5(-1.1,-1.95) 6(-2.2,-1.95) 7(-3.3,-1.95) 8(-4.4,-1.95)
  rrect0% 1.5x2 smd paste+0 mask+0: 9(6.9,3.75) 10(-6.9,3.75) 11(6.9,-4.55) 12(-6.9,-4.55)
Top Silk:
  lines w0.1: -6.8,-7.45 -5.2,-7.45 -5.2,-5.55 4.1,-5.55 4.1,-7.45 6.8,-7.45 ; -6.8,-3.25 -6.8,2.4 ; -6.8,5.05 -6.8,7.75 6.8,7.75 6.8,5.05
  text ".Designator" at 0,0 h0.7
Top Assembly:
  region: 0.4,-6.75 0,-5.75 -0.4,-6.75
  lines w0.05: 0,-7.4 0,-6.25 ; -6.8,-7.45 -6.8,7.75 6.8,7.75 6.8,-7.45 4.1,-7.45 4.1,-5.55 -5.2,-5.55 -5.2,-7.45 -6.8,-7.45 ; -4,-2.95 cw(c-4.001,-1.95) -4,-0.95 4,-0.95 cw(c4.001,-1.95) 4,-2.95 -4,-2.95
Top Placement:
  lines w0.01: -8.1,-7.95 8,-7.95 8,8.25 -8.1,8.25 -8.1,-7.95

## TPN-17080236 [mm]
height 4.8
pads (22):
  rrect21% 0.7x2 smd paste+0 mask+0.1: 1(-5.625,3.15) 2(-5.625,-3.15) 3(-4.375,3.15) 4(-4.375,-3.15) 5(-3.125,3.15) 6(-3.125,-3.15) 7(-1.875,3.15) 8(-1.875,-3.15) 9(-0.625,3.15) 10(-0.625,-3.15) 11(0.625,3.15) 12(0.625,-3.15) 13(1.875,3.15) 14(1.875,-3.15) 15(3.125,3.15) 16(3.125,-3.15) 17(4.375,3.15) 18(4.375,-3.15) 19(5.625,3.15) 20(5.625,-3.15)
  rrect10% 2x2.3 smd paste+0 mask+0.1: 21(-8.5,0) 22(8.5,0)
Top Silk:
  lines w0.1: -9.2,-1.45 -9.2,-2.75 -6.325,-2.75 ; -9.2,1.45 -9.2,2.75 -6.325,2.75 ; 6.3,-2.75 9.2,-2.75 9.2,-1.45 ; 6.3,2.75 9.2,2.75 9.2,1.45
  text "1" at -6.525,2.85 h0.7
  text ".Designator" at -6.225,4.55 h0.7
  text ".Comment" at 1.275,4.55 h0.7
Top Assembly:
  region: -7.225,-2.05 -6.525,-2.05 -6.525,-1.35 -7.225,-1.35
  region: 6.575,-2.05 7.275,-2.05 7.275,-1.35 6.575,-1.35
  lines w0.05: -9.2,-2.35 9.2,-2.35 9.2,-2.05 7.575,-2.05 7.575,2.05 9.2,2.05 9.2,2.35 -9.2,2.35 -9.2,2.05 -7.525,2.05 -7.525,-2.05 -9.2,-2.05 -9.2,-2.35 ; -7.225,-2.05 7.275,-2.05 7.275,2.05 -7.225,2.05 -7.225,-2.05
  text "1" at -5.725,0.45 h0.7
  text "20" at 4.975,-1.95 h0.7
Top Placement:
  lines w0.01: -9.2,-2.75 9.2,-2.75 9.2,2.75 -9.2,2.75 -9.2,-2.75